# Altium footprint library ST封装.PcbLib: 1336 footprints (part 42 of 109)
Each footprint in its own frame and in the unit in brackets; x right, y up, seen from the top. Pads: shape width x height; smd on the part's side, far side on the other; paste and mask are expansions set on the pad; w line width, h text height; cw(c..) or ccw(c..) is an arc to the next point about the centre after c.
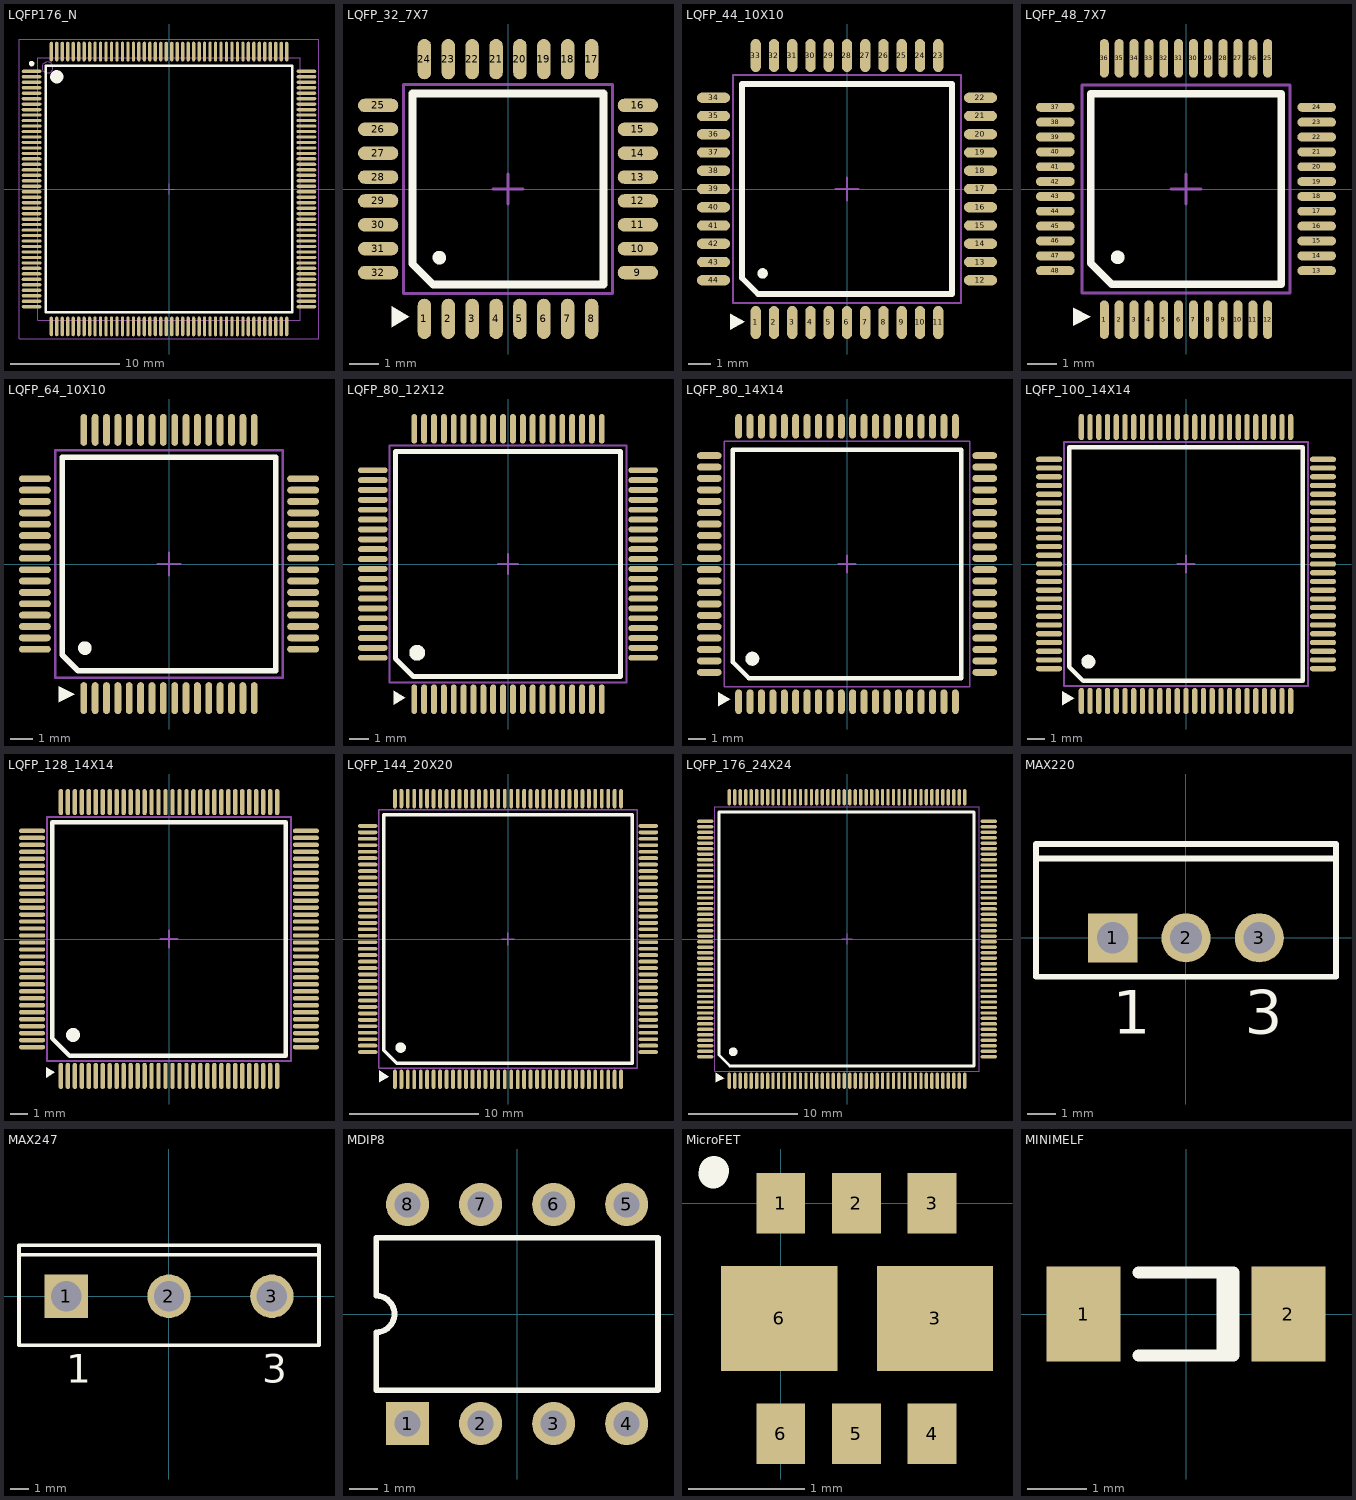
[diagram p41: the footprints below, top view; thin cyan lines are the x and y axes]

## LQFP176_N [mm] "Thin QFP, 176-Leads, Body 24x24mm, Pitch 0.5mm, IPC Medium Density"
height 1.6
pads (176):
  oval 1.8x0.3 smd: 1(-12.55,10.75) 2(-12.55,10.25) 3(-12.55,9.75) 4(-12.55,9.25) 5(-12.55,8.75) 6(-12.55,8.25) 7(-12.55,7.75) 8(-12.55,7.25) 9(-12.55,6.75) 10(-12.55,6.25) 11(-12.55,5.75) 12(-12.55,5.25) 13(-12.55,4.75) 14(-12.55,4.25) 15(-12.55,3.75) 16(-12.55,3.25) 17(-12.55,2.75) 18(-12.55,2.25) 19(-12.55,1.75) 20(-12.55,1.25) 21(-12.55,0.75) 22(-12.55,0.25) 23(-12.55,-0.25) 24(-12.55,-0.75) 25(-12.55,-1.25) 26(-12.55,-1.75) 27(-12.55,-2.25) 28(-12.55,-2.75) 29(-12.55,-3.25) 30(-12.55,-3.75) 31(-12.55,-4.25) 32(-12.55,-4.75) 33(-12.55,-5.25) 34(-12.55,-5.75) 35(-12.55,-6.25) 36(-12.55,-6.75) 37(-12.55,-7.25) 38(-12.55,-7.75) 39(-12.55,-8.25) 40(-12.55,-8.75) 41(-12.55,-9.25) 42(-12.55,-9.75) 43(-12.55,-10.25) 44(-12.55,-10.75) 89(12.55,-10.75) 90(12.55,-10.25) 91(12.55,-9.75) 92(12.55,-9.25) 93(12.55,-8.75) 94(12.55,-8.25) 95(12.55,-7.75) 96(12.55,-7.25) 97(12.55,-6.75) 98(12.55,-6.25) 99(12.55,-5.75) 100(12.55,-5.25) 101(12.55,-4.75) 102(12.55,-4.25) 103(12.55,-3.75) 104(12.55,-3.25) 105(12.55,-2.75) 106(12.55,-2.25) 107(12.55,-1.75) 108(12.55,-1.25) 109(12.55,-0.75) 110(12.55,-0.25) 111(12.55,0.25) 112(12.55,0.75) 113(12.55,1.25) 114(12.55,1.75) 115(12.55,2.25) 116(12.55,2.75) 117(12.55,3.25) 118(12.55,3.75) 119(12.55,4.25) 120(12.55,4.75) 121(12.55,5.25) 122(12.55,5.75) 123(12.55,6.25) 124(12.55,6.75) 125(12.55,7.25) 126(12.55,7.75) 127(12.55,8.25) 128(12.55,8.75) 129(12.55,9.25) 130(12.55,9.75) 131(12.55,10.25) 132(12.55,10.75)
  oval 0.3x1.8 smd: 45(-10.75,-12.55) 46(-10.25,-12.55) 47(-9.75,-12.55) 48(-9.25,-12.55) 49(-8.75,-12.55) 50(-8.25,-12.55) 51(-7.75,-12.55) 52(-7.25,-12.55) 53(-6.75,-12.55) 54(-6.25,-12.55) 55(-5.75,-12.55) 56(-5.25,-12.55) 57(-4.75,-12.55) 58(-4.25,-12.55) 59(-3.75,-12.55) 60(-3.25,-12.55) 61(-2.75,-12.55) 62(-2.25,-12.55) 63(-1.75,-12.55) 64(-1.25,-12.55) 65(-0.75,-12.55) 66(-0.25,-12.55) 67(0.25,-12.55) 68(0.75,-12.55) 69(1.25,-12.55) 70(1.75,-12.55) 71(2.25,-12.55) 72(2.75,-12.55) 73(3.25,-12.55) 74(3.75,-12.55) 75(4.25,-12.55) 76(4.75,-12.55) 77(5.25,-12.55) 78(5.75,-12.55) 79(6.25,-12.55) 80(6.75,-12.55) 81(7.25,-12.55) 82(7.75,-12.55) 83(8.25,-12.55) 84(8.75,-12.55) 85(9.25,-12.55) 86(9.75,-12.55) 87(10.25,-12.55) 88(10.75,-12.55) 133(10.75,12.55) 134(10.25,12.55) 135(9.75,12.55) 136(9.25,12.55) 137(8.75,12.55) 138(8.25,12.55) 139(7.75,12.55) 140(7.25,12.55) 141(6.75,12.55) 142(6.25,12.55) 143(5.75,12.55) 144(5.25,12.55) 145(4.75,12.55) 146(4.25,12.55) 147(3.75,12.55) 148(3.25,12.55) 149(2.75,12.55) 150(2.25,12.55) 151(1.75,12.55) 152(1.25,12.55) 153(0.75,12.55) 154(0.25,12.55) 155(-0.25,12.55) 156(-0.75,12.55) 157(-1.25,12.55) 158(-1.75,12.55) 159(-2.25,12.55) 160(-2.75,12.55) 161(-3.25,12.55) 162(-3.75,12.55) 163(-4.25,12.55) 164(-4.75,12.55) 165(-5.25,12.55) 166(-5.75,12.55) 167(-6.25,12.55) 168(-6.75,12.55) 169(-7.25,12.55) 170(-7.75,12.55) 171(-8.25,12.55) 172(-8.75,12.55) 173(-9.25,12.55) 174(-9.75,12.55) 175(-10.25,12.55) 176(-10.75,12.55)
Top Overlay:
  circle w0.25: c-12.55,11.45 r0.125
  circle w0.6: c-10.25,10.25 r0.3
  lines w0.2: -11.25,-11.25 -11.25,11.25 11.25,11.25 11.25,-11.25 -11.25,-11.25
Mechanical 13:
  circle w0.1: c-11.1,11.1 r0.5
  lines w0.1: -12,-12 -12,12 12,12 12,-12 -12,-12
Mechanical 15:
  lines w0.05: -13.7,-13.7 -13.7,13.7 13.7,13.7 13.7,-13.7 -13.7,-13.7
  lines w0.1: -0.5,0 0.5,0 ; 0,-0.5 0,0.5
3D body: height 1.6, standoff 0, extent -12,-12 12,12

## LQFP_32_7X7 [mm]
pads (32):
  oval 0.45x1.35 smd: 1(-2.8,-4.35) 2(-2,-4.35) 3(-1.2,-4.35) 4(-0.4,-4.35) 5(0.4,-4.35) 6(1.2,-4.35) 7(2,-4.35) 8(2.8,-4.35) 17(2.8,4.35) 18(2,4.35) 19(1.2,4.35) 20(0.4,4.35) 21(-0.4,4.35) 22(-1.2,4.35) 23(-2,4.35) 24(-2.8,4.35)
  oval 1.35x0.45 smd: 9(4.35,-2.8) 10(4.35,-2) 11(4.35,-1.2) 12(4.35,-0.4) 13(4.35,0.4) 14(4.35,1.2) 15(4.35,2) 16(4.35,2.8) 25(-4.35,2.8) 26(-4.35,2) 27(-4.35,1.2) 28(-4.35,0.4) 29(-4.35,-0.4) 30(-4.35,-1.2) 31(-4.35,-2) 32(-4.35,-2.8)
Top Overlay:
  circle w0.254: c-2.3,-2.3 r0.1
  region: -3.3,-4.275 -3.9,-3.925 -3.9,-4.625
  lines w0.254: -3.2,-2.5 -2.5,-3.2 3.2,-3.2 3.2,3.2 -3.2,3.2 -3.2,-2.5
Mechanical 15:
  lines w0.1: -0.5,0 0.5,0 ; 0,-0.5 0,0.5 ; -3.5,-3.5 3.5,-3.5 3.5,3.5 -3.5,3.5 -3.5,-3.5
3D body "LQFP-32-9x9.STEP": height 1.62, standoff -0.01, extent -4.572,-4.57 4.572,4.573

## LQFP_44_10X10 [mm]
pads (44):
  oval 0.45x1.45 smd: 1(-4,-5.85) 2(-3.2,-5.85) 3(-2.4,-5.85) 4(-1.6,-5.85) 5(-0.8,-5.85) 6(0,-5.85) 7(0.8,-5.85) 8(1.6,-5.85) 9(2.4,-5.85) 10(3.2,-5.85) 11(4,-5.85) 23(4,5.85) 24(3.2,5.85) 25(2.4,5.85) 26(1.6,5.85) 27(0.8,5.85) 28(0,5.85) 29(-0.8,5.85) 30(-1.6,5.85) 31(-2.4,5.85) 32(-3.2,5.85) 33(-4,5.85)
  oval 1.45x0.45 smd: 12(5.85,-4) 13(5.85,-3.2) 14(5.85,-2.4) 15(5.85,-1.6) 16(5.85,-0.8) 17(5.85,0) 18(5.85,0.8) 19(5.85,1.6) 20(5.85,2.4) 21(5.85,3.2) 22(5.85,4) 34(-5.85,4) 35(-5.85,3.2) 36(-5.85,2.4) 37(-5.85,1.6) 38(-5.85,0.8) 39(-5.85,0) 40(-5.85,-0.8) 41(-5.85,-1.6) 42(-5.85,-2.4) 43(-5.85,-3.2) 44(-5.85,-4)
Top Overlay:
  circle w0.254: c-3.7,-3.7 r0.1
  region: -4.488,-5.825 -5.113,-5.475 -5.113,-6.175
  lines w0.254: -4.6,-3.9 -3.9,-4.6 4.6,-4.6 4.6,4.6 -4.6,4.6 -4.6,-3.9
Mechanical 15:
  lines w0.1: -0.5,0 0.5,0 ; 0,-0.5 0,0.5 ; -5,-5 5,-5 5,5 -5,5 -5,-5
3D body "LQFP-44-10X10.step": height 1.5, standoff 0.02, extent -6,-6 6,6

## LQFP_48_7X7 [mm]
pads (48):
  oval 0.3x1.3 smd: 1(-2.75,-4.4) 2(-2.25,-4.4) 3(-1.75,-4.4) 4(-1.25,-4.4) 5(-0.75,-4.4) 6(-0.25,-4.4) 7(0.25,-4.4) 8(0.75,-4.4) 9(1.25,-4.4) 10(1.75,-4.4) 11(2.25,-4.4) 12(2.75,-4.4) 25(2.75,4.4) 26(2.25,4.4) 27(1.75,4.4) 28(1.25,4.4) 29(0.75,4.4) 30(0.25,4.4) 31(-0.25,4.4) 32(-0.75,4.4) 33(-1.25,4.4) 34(-1.75,4.4) 35(-2.25,4.4) 36(-2.75,4.4)
  oval 1.3x0.3 smd: 13(4.4,-2.75) 14(4.4,-2.25) 15(4.4,-1.75) 16(4.4,-1.25) 17(4.4,-0.75) 18(4.4,-0.25) 19(4.4,0.25) 20(4.4,0.75) 21(4.4,1.25) 22(4.4,1.75) 23(4.4,2.25) 24(4.4,2.75) 37(-4.4,2.75) 38(-4.4,2.25) 39(-4.4,1.75) 40(-4.4,1.25) 41(-4.4,0.75) 42(-4.4,0.25) 43(-4.4,-0.25) 44(-4.4,-0.75) 45(-4.4,-1.25) 46(-4.4,-1.75) 47(-4.4,-2.25) 48(-4.4,-2.75)
Top Overlay:
  circle w0.254: c-2.3,-2.3 r0.1
  region: -3.2,-4.3 -3.8,-4 -3.8,-4.6
  lines w0.254: -3.2,-2.5 -3.2,3.2 3.2,3.2 3.2,-3.2 -2.5,-3.2 -3.2,-2.5
Mechanical 15:
  lines w0.1: -0.5,0 0.5,0 ; 0,-0.5 0,0.5 ; -3.5,-3.5 -3.5,3.5 3.5,3.5 3.5,-3.5 -3.5,-3.5
3D body "LQFP-48-7x7.STEP": height 1.62, standoff -0.01, extent -4.572,-4.57 4.572,4.573

## LQFP_64_10X10 [mm]
pads (64):
  oval 0.3x1.4 smd: 1(-3.75,-5.9) 2(-3.25,-5.9) 3(-2.75,-5.9) 4(-2.25,-5.9) 5(-1.75,-5.9) 6(-1.25,-5.9) 7(-0.75,-5.9) 8(-0.25,-5.9) 9(0.25,-5.9) 10(0.75,-5.9) 11(1.25,-5.9) 12(1.75,-5.9) 13(2.25,-5.9) 14(2.75,-5.9) 15(3.25,-5.9) 16(3.75,-5.9) 33(3.75,5.9) 34(3.25,5.9) 35(2.75,5.9) 36(2.25,5.9) 37(1.75,5.9) 38(1.25,5.9) 39(0.75,5.9) 40(0.25,5.9) 41(-0.25,5.9) 42(-0.75,5.9) 43(-1.25,5.9) 44(-1.75,5.9) 45(-2.25,5.9) 46(-2.75,5.9) 47(-3.25,5.9) 48(-3.75,5.9)
  oval 1.4x0.3 smd: 17(5.9,-3.75) 18(5.9,-3.25) 19(5.9,-2.75) 20(5.9,-2.25) 21(5.9,-1.75) 22(5.9,-1.25) 23(5.9,-0.75) 24(5.9,-0.25) 25(5.9,0.25) 26(5.9,0.75) 27(5.9,1.25) 28(5.9,1.75) 29(5.9,2.25) 30(5.9,2.75) 31(5.9,3.25) 32(5.9,3.75) 49(-5.9,3.75) 50(-5.9,3.25) 51(-5.9,2.75) 52(-5.9,2.25) 53(-5.9,1.75) 54(-5.9,1.25) 55(-5.9,0.75) 56(-5.9,0.25) 57(-5.9,-0.25) 58(-5.9,-0.75) 59(-5.9,-1.25) 60(-5.9,-1.75) 61(-5.9,-2.25) 62(-5.9,-2.75) 63(-5.9,-3.25) 64(-5.9,-3.75)
Top Overlay:
  circle w0.4: c-3.7,-3.7 r0.1
  region: -4.15,-5.725 -4.85,-5.375 -4.85,-6.075
  lines w0.254: -4.7,-4 -4.7,4.7 4.7,4.7 4.7,-4.7 -4,-4.7 -4.7,-4
Mechanical 15:
  lines w0.1: -0.5,0 0.5,0 ; 0,-0.5 0,0.5 ; -5,-5 5,-5 5,5 -5,5 -5,-5
3D body "LQFP-64-10x10.STEP": height 1.62, standoff -0.01, extent -6.072,-6.07 6.072,6.073

## LQFP_80_12X12 [mm]
pads (80):
  oval 0.3x1.5 smd: 1(-4.75,-6.85) 2(-4.25,-6.85) 3(-3.75,-6.85) 4(-3.25,-6.85) 5(-2.75,-6.85) 6(-2.25,-6.85) 7(-1.75,-6.85) 8(-1.25,-6.85) 9(-0.75,-6.85) 10(-0.25,-6.85) 11(0.25,-6.85) 12(0.75,-6.85) 13(1.25,-6.85) 14(1.75,-6.85) 15(2.25,-6.85) 16(2.75,-6.85) 17(3.25,-6.85) 18(3.75,-6.85) 19(4.25,-6.85) 20(4.75,-6.85) 41(4.75,6.85) 42(4.25,6.85) 43(3.75,6.85) 44(3.25,6.85) 45(2.75,6.85) 46(2.25,6.85) 47(1.75,6.85) 48(1.25,6.85) 49(0.75,6.85) 50(0.25,6.85) 51(-0.25,6.85) 52(-0.75,6.85) 53(-1.25,6.85) 54(-1.75,6.85) 55(-2.25,6.85) 56(-2.75,6.85) 57(-3.25,6.85) 58(-3.75,6.85) 59(-4.25,6.85) 60(-4.75,6.85)
  oval 1.5x0.3 smd: 21(6.85,-4.75) 22(6.85,-4.25) 23(6.85,-3.75) 24(6.85,-3.25) 25(6.85,-2.75) 26(6.85,-2.25) 27(6.85,-1.75) 28(6.85,-1.25) 29(6.85,-0.75) 30(6.85,-0.25) 31(6.85,0.25) 32(6.85,0.75) 33(6.85,1.25) 34(6.85,1.75) 35(6.85,2.25) 36(6.85,2.75) 37(6.85,3.25) 38(6.85,3.75) 39(6.85,4.25) 40(6.85,4.75) 61(-6.85,4.75) 62(-6.85,4.25) 63(-6.85,3.75) 64(-6.85,3.25) 65(-6.85,2.75) 66(-6.85,2.25) 67(-6.85,1.75) 68(-6.85,1.25) 69(-6.85,0.75) 70(-6.85,0.25) 71(-6.85,-0.25) 72(-6.85,-0.75) 73(-6.85,-1.25) 74(-6.85,-1.75) 75(-6.85,-2.25) 76(-6.85,-2.75) 77(-6.85,-3.25) 78(-6.85,-3.75) 79(-6.85,-4.25) 80(-6.85,-4.75)
Top Overlay:
  circle w0.4: c-4.6,-4.5 r0.2
  region: -5.2,-6.775 -5.8,-6.425 -5.8,-7.125
  lines w0.254: -5.7,-4.8 -5.7,5.7 5.7,5.7 5.7,-5.7 -4.8,-5.7 -5.7,-4.8
Mechanical 15:
  lines w0.1: -0.5,0 0.5,0 ; 0,-0.5 0,0.5 ; -6,-6 -6,6 6,6 6,-6 -6,-6
3D body "LQFP-80-12X12.STEP": height 1.62, standoff -0.01, extent -7.073,-7.073 7.07,7.07

## LQFP_80_14X14 [mm]
pads (80):
  oval 0.4x1.4 smd mask+0.051: 1(-6.175,-7.85) 2(-5.525,-7.85) 3(-4.875,-7.85) 4(-4.225,-7.85) 5(-3.575,-7.85) 6(-2.925,-7.85) 7(-2.275,-7.85) 8(-1.625,-7.85) 9(-0.975,-7.85) 10(-0.325,-7.85) 11(0.325,-7.85) 12(0.975,-7.85) 13(1.625,-7.85) 14(2.275,-7.85) 15(2.925,-7.85) 16(3.575,-7.85) 17(4.225,-7.85) 18(4.875,-7.85) 19(5.525,-7.85) 20(6.175,-7.85) 41(6.175,7.85) 42(5.525,7.85) 43(4.875,7.85) 44(4.225,7.85) 45(3.575,7.85) 46(2.925,7.85) 47(2.275,7.85) 48(1.625,7.85) 49(0.975,7.85) 50(0.325,7.85) 51(-0.325,7.85) 52(-0.975,7.85) 53(-1.625,7.85) 54(-2.275,7.85) 55(-2.925,7.85) 56(-3.575,7.85) 57(-4.225,7.85) 58(-4.875,7.85) 59(-5.525,7.85) 60(-6.175,7.85)
  oval 1.4x0.4 smd mask+0.051: 21(7.85,-6.175) 22(7.85,-5.525) 23(7.85,-4.875) 24(7.85,-4.225) 25(7.85,-3.575) 26(7.85,-2.925) 27(7.85,-2.275) 28(7.85,-1.625) 29(7.85,-0.975) 30(7.85,-0.325) 31(7.85,0.325) 32(7.85,0.975) 33(7.85,1.625) 34(7.85,2.275) 35(7.85,2.925) 36(7.85,3.575) 37(7.85,4.225) 38(7.85,4.875) 39(7.85,5.525) 40(7.85,6.175) 61(-7.85,6.175) 62(-7.85,5.525) 63(-7.85,4.875) 64(-7.85,4.225) 65(-7.85,3.575) 66(-7.85,2.925) 67(-7.85,2.275) 68(-7.85,1.625) 69(-7.85,0.975) 70(-7.85,0.325) 71(-7.85,-0.325) 72(-7.85,-0.975) 73(-7.85,-1.625) 74(-7.85,-2.275) 75(-7.85,-2.925) 76(-7.85,-3.575) 77(-7.85,-4.225) 78(-7.85,-4.875) 79(-7.85,-5.525) 80(-7.85,-6.175)
Top Overlay:
  circle w0.4: c-5.4,-5.4 r0.2
  region: -7.35,-7.3 -7.35,-8.1 -6.65,-7.7
  lines w0.254: -6.5,-5.6 -6.5,6.5 6.5,6.5 6.5,-6.5 -5.6,-6.5 -6.5,-5.6
Mechanical 15:
  lines w0.1: -0.5,0 0.5,0 ; 0,-0.5 0,0.5 ; -7,-7 7,-7 7,7 -7,7 -7,-7
3D body "LQFP-80-14x14.step": height 1.58, standoff -0.01, extent -8.005,-8 8.005,8.009

## LQFP_100_14X14 [mm]
pads (100):
  oval 0.3x1.5 smd: 1(-6,-7.85) 2(-5.5,-7.85) 3(-5,-7.85) 4(-4.5,-7.85) 5(-4,-7.85) 6(-3.5,-7.85) 7(-3,-7.85) 8(-2.5,-7.85) 9(-2,-7.85) 10(-1.5,-7.85) 11(-1,-7.85) 12(-0.5,-7.85) 13(0,-7.85) 14(0.5,-7.85) 15(1,-7.85) 16(1.5,-7.85) 17(2,-7.85) 18(2.5,-7.85) 19(3,-7.85) 20(3.5,-7.85) 21(4,-7.85) 22(4.5,-7.85) 23(5,-7.85) 24(5.5,-7.85) 25(6,-7.85) 51(6,7.85) 52(5.5,7.85) 53(5,7.85) 54(4.5,7.85) 55(4,7.85) 56(3.5,7.85) 57(3,7.85) 58(2.5,7.85) 59(2,7.85) 60(1.5,7.85) 61(1,7.85) 62(0.5,7.85) 63(0,7.85) 64(-0.5,7.85) 65(-1,7.85) 66(-1.5,7.85) 67(-2,7.85) 68(-2.5,7.85) 69(-3,7.85) 70(-3.5,7.85) 71(-4,7.85) 72(-4.5,7.85) 73(-5,7.85) 74(-5.5,7.85) 75(-6,7.85)
  oval 1.5x0.3 smd: 26(7.85,-6) 27(7.85,-5.5) 28(7.85,-5) 29(7.85,-4.5) 30(7.85,-4) 31(7.85,-3.5) 32(7.85,-3) 33(7.85,-2.5) 34(7.85,-2) 35(7.85,-1.5) 36(7.85,-1) 37(7.85,-0.5) 38(7.85,0) 39(7.85,0.5) 40(7.85,1) 41(7.85,1.5) 42(7.85,2) 43(7.85,2.5) 44(7.85,3) 45(7.85,3.5) 46(7.85,4) 47(7.85,4.5) 48(7.85,5) 49(7.85,5.5) 50(7.85,6) 76(-7.85,6) 77(-7.85,5.5) 78(-7.85,5) 79(-7.85,4.5) 80(-7.85,4) 81(-7.85,3.5) 82(-7.85,3) 83(-7.85,2.5) 84(-7.85,2) 85(-7.85,1.5) 86(-7.85,1) 87(-7.85,0.5) 88(-7.85,0) 89(-7.85,-0.5) 90(-7.85,-1) 91(-7.85,-1.5) 92(-7.85,-2) 93(-7.85,-2.5) 94(-7.85,-3) 95(-7.85,-3.5) 96(-7.85,-4) 97(-7.85,-4.5) 98(-7.85,-5) 99(-7.85,-5.5) 100(-7.85,-6)
Top Overlay:
  circle w0.4: c-5.6,-5.6 r0.2
  region: -6.4,-7.7 -7.1,-7.3 -7.1,-8.1
  lines w0.254: -6.7,-5.9 -6.7,6.7 6.7,6.7 6.7,-6.7 -5.9,-6.7 -6.7,-5.9
Mechanical 15:
  lines w0.1: -0.5,0 0.5,0 ; 0,-0.5 0,0.5 ; -7,-7 7,-7 7,7 -7,7 -7,-7
3D body "LQFP-100-14x14.STEP": height 1.62, standoff -0.01, extent -8.072,-8.08 8.072,8.063

## LQFP_128_14X14 [mm]
pads (128):
  oval 0.25x1.5 smd mask+0.051: 1(-6.2,-7.85) 2(-5.8,-7.85) 3(-5.4,-7.85) 4(-5,-7.85) 5(-4.6,-7.85) 6(-4.2,-7.85) 7(-3.8,-7.85) 8(-3.4,-7.85) 9(-3,-7.85) 10(-2.6,-7.85) 11(-2.2,-7.85) 12(-1.8,-7.85) 13(-1.4,-7.85) 14(-1,-7.85) 15(-0.6,-7.85) 16(-0.2,-7.85) 17(0.2,-7.85) 18(0.6,-7.85) 19(1,-7.85) 20(1.4,-7.85) 21(1.8,-7.85) 22(2.2,-7.85) 23(2.6,-7.85) 24(3,-7.85) 25(3.4,-7.85) 26(3.8,-7.85) 27(4.2,-7.85) 28(4.6,-7.85) 29(5,-7.85) 30(5.4,-7.85) 31(5.8,-7.85) 32(6.2,-7.85) 65(6.2,7.85) 66(5.8,7.85) 67(5.4,7.85) 68(5,7.85) 69(4.6,7.85) 70(4.2,7.85) 71(3.8,7.85) 72(3.4,7.85) 73(3,7.85) 74(2.6,7.85) 75(2.2,7.85) 76(1.8,7.85) 77(1.4,7.85) 78(1,7.85) 79(0.6,7.85) 80(0.2,7.85) 81(-0.2,7.85) 82(-0.6,7.85) 83(-1,7.85) 84(-1.4,7.85) 85(-1.8,7.85) 86(-2.2,7.85) 87(-2.6,7.85) 88(-3,7.85) 89(-3.4,7.85) 90(-3.8,7.85) 91(-4.2,7.85) 92(-4.6,7.85) 93(-5,7.85) 94(-5.4,7.85) 95(-5.8,7.85) 96(-6.2,7.85)
  oval 1.5x0.25 smd mask+0.051: 33(7.85,-6.2) 34(7.85,-5.8) 35(7.85,-5.4) 36(7.85,-5) 37(7.85,-4.6) 38(7.85,-4.2) 39(7.85,-3.8) 40(7.85,-3.4) 41(7.85,-3) 42(7.85,-2.6) 43(7.85,-2.2) 44(7.85,-1.8) 45(7.85,-1.4) 46(7.85,-1) 47(7.85,-0.6) 48(7.85,-0.2) 49(7.85,0.2) 50(7.85,0.6) 51(7.85,1) 52(7.85,1.4) 53(7.85,1.8) 54(7.85,2.2) 55(7.85,2.6) 56(7.85,3) 57(7.85,3.4) 58(7.85,3.8) 59(7.85,4.2) 60(7.85,4.6) 61(7.85,5) 62(7.85,5.4) 63(7.85,5.8) 64(7.85,6.2) 97(-7.85,6.2) 98(-7.85,5.8) 99(-7.85,5.4) 100(-7.85,5) 101(-7.85,4.6) 102(-7.85,4.2) 103(-7.85,3.8) 104(-7.85,3.4) 105(-7.85,3) 106(-7.85,2.6) 107(-7.85,2.2) 108(-7.85,1.8) 109(-7.85,1.4) 110(-7.85,1) 111(-7.85,0.6) 112(-7.85,0.2) 113(-7.85,-0.2) 114(-7.85,-0.6) 115(-7.85,-1) 116(-7.85,-1.4) 117(-7.85,-1.8) 118(-7.85,-2.2) 119(-7.85,-2.6) 120(-7.85,-3) 121(-7.85,-3.4) 122(-7.85,-3.8) 123(-7.85,-4.2) 124(-7.85,-4.6) 125(-7.85,-5) 126(-7.85,-5.4) 127(-7.85,-5.8) 128(-7.85,-6.2)
Top Overlay:
  circle w0.4: c-5.5,-5.5 r0.2
  region: -7.05,-7.95 -6.55,-7.65 -7.05,-7.35
  lines w0.254: -6.7,-5.7 -6.7,6.7 6.7,6.7 6.7,-6.7 -5.7,-6.7 -6.7,-5.7
Mechanical 15:
  lines w0.1: -0.5,0 0.5,0 ; 0,-0.5 0,0.5 ; -7,-7 -7,7 7,7 7,-7 -7,-7
3D body "LQFP-128-14X14.step": height 1.35, standoff 0, extent -8,-8 8,8

## LQFP_144_20X20 [mm]
pads (144):
  oval 0.3x1.5 smd: 1(-8.75,-10.85) 2(-8.25,-10.85) 3(-7.75,-10.85) 4(-7.25,-10.85) 5(-6.75,-10.85) 6(-6.25,-10.85) 7(-5.75,-10.85) 8(-5.25,-10.85) 9(-4.75,-10.85) 10(-4.25,-10.85) 11(-3.75,-10.85) 12(-3.25,-10.85) 13(-2.75,-10.85) 14(-2.25,-10.85) 15(-1.75,-10.85) 16(-1.25,-10.85) 17(-0.75,-10.85) 18(-0.25,-10.85) 19(0.25,-10.85) 20(0.75,-10.85) 21(1.25,-10.85) 22(1.75,-10.85) 23(2.25,-10.85) 24(2.75,-10.85) 25(3.25,-10.85) 26(3.75,-10.85) 27(4.25,-10.85) 28(4.75,-10.85) 29(5.25,-10.85) 30(5.75,-10.85) 31(6.25,-10.85) 32(6.75,-10.85) 33(7.25,-10.85) 34(7.75,-10.85) 35(8.25,-10.85) 36(8.75,-10.85) 73(8.75,10.85) 74(8.25,10.85) 75(7.75,10.85) 76(7.25,10.85) 77(6.75,10.85) 78(6.25,10.85) 79(5.75,10.85) 80(5.25,10.85) 81(4.75,10.85) 82(4.25,10.85) 83(3.75,10.85) 84(3.25,10.85) 85(2.75,10.85) 86(2.25,10.85) 87(1.75,10.85) 88(1.25,10.85) 89(0.75,10.85) 90(0.25,10.85) 91(-0.25,10.85) 92(-0.75,10.85) 93(-1.25,10.85) 94(-1.75,10.85) 95(-2.25,10.85) 96(-2.75,10.85) 97(-3.25,10.85) 98(-3.75,10.85) 99(-4.25,10.85) 100(-4.75,10.85) 101(-5.25,10.85) 102(-5.75,10.85) 103(-6.25,10.85) 104(-6.75,10.85) 105(-7.25,10.85) 106(-7.75,10.85) 107(-8.25,10.85) 108(-8.75,10.85)
  oval 1.5x0.3 smd: 37(10.85,-8.75) 38(10.85,-8.25) 39(10.85,-7.75) 40(10.85,-7.25) 41(10.85,-6.75) 42(10.85,-6.25) 43(10.85,-5.75) 44(10.85,-5.25) 45(10.85,-4.75) 46(10.85,-4.25) 47(10.85,-3.75) 48(10.85,-3.25) 49(10.85,-2.75) 50(10.85,-2.25) 51(10.85,-1.75) 52(10.85,-1.25) 53(10.85,-0.75) 54(10.85,-0.25) 55(10.85,0.25) 56(10.85,0.75) 57(10.85,1.25) 58(10.85,1.75) 59(10.85,2.25) 60(10.85,2.75) 61(10.85,3.25) 62(10.85,3.75) 63(10.85,4.25) 64(10.85,4.75) 65(10.85,5.25) 66(10.85,5.75) 67(10.85,6.25) 68(10.85,6.75) 69(10.85,7.25) 70(10.85,7.75) 71(10.85,8.25) 72(10.85,8.75) 109(-10.85,8.75) 110(-10.85,8.25) 111(-10.85,7.75) 112(-10.85,7.25) 113(-10.85,6.75) 114(-10.85,6.25) 115(-10.85,5.75) 116(-10.85,5.25) 117(-10.85,4.75) 118(-10.85,4.25) 119(-10.85,3.75) 120(-10.85,3.25) 121(-10.85,2.75) 122(-10.85,2.25) 123(-10.85,1.75) 124(-10.85,1.25) 125(-10.85,0.75) 126(-10.85,0.25) 127(-10.85,-0.25) 128(-10.85,-0.75) 129(-10.85,-1.25) 130(-10.85,-1.75) 131(-10.85,-2.25) 132(-10.85,-2.75) 133(-10.85,-3.25) 134(-10.85,-3.75) 135(-10.85,-4.25) 136(-10.85,-4.75) 137(-10.85,-5.25) 138(-10.85,-5.75) 139(-10.85,-6.25) 140(-10.85,-6.75) 141(-10.85,-7.25) 142(-10.85,-7.75) 143(-10.85,-8.25) 144(-10.85,-8.75)
Top Overlay:
  circle w0.4: c-8.3,-8.4 r0.2
  region: -9.225,-10.637 -9.975,-10.162 -9.975,-11.062
  lines w0.254: -9.6,-8.6 -9.6,9.6 9.6,9.6 9.6,-9.6 -8.6,-9.6 -9.6,-8.6
Mechanical 15:
  lines w0.1: -0.5,0 0.5,0 ; 0,-0.5 0,0.5 ; -10,-10 10,-10 10,10 -10,10 -10,-10
3D body "LQFP-144-20x20.STEP": height 1.88, standoff -0.01, extent -11.102,-11.1 11.1,11.102

## LQFP_176_24X24 [mm]
pads (176):
  oval 0.3x1.5 smd: 1(-10.75,-12.95) 2(-10.25,-12.95) 3(-9.75,-12.95) 4(-9.25,-12.95) 5(-8.75,-12.95) 6(-8.25,-12.95) 7(-7.75,-12.95) 8(-7.25,-12.95) 9(-6.75,-12.95) 10(-6.25,-12.95) 11(-5.75,-12.95) 12(-5.25,-12.95) 13(-4.75,-12.95) 14(-4.25,-12.95) 15(-3.75,-12.95) 16(-3.25,-12.95) 17(-2.75,-12.95) 18(-2.25,-12.95) 19(-1.75,-12.95) 20(-1.25,-12.95) 21(-0.75,-12.95) 22(-0.25,-12.95) 23(0.25,-12.95) 24(0.75,-12.95) 25(1.25,-12.95) 26(1.75,-12.95) 27(2.25,-12.95) 28(2.75,-12.95) 29(3.25,-12.95) 30(3.75,-12.95) 31(4.25,-12.95) 32(4.75,-12.95) 33(5.25,-12.95) 34(5.75,-12.95) 35(6.25,-12.95) 36(6.75,-12.95) 37(7.25,-12.95) 38(7.75,-12.95) 39(8.25,-12.95) 40(8.75,-12.95) 41(9.25,-12.95) 42(9.75,-12.95) 43(10.25,-12.95) 44(10.75,-12.95) 89(10.75,12.95) 90(10.25,12.95) 91(9.75,12.95) 92(9.25,12.95) 93(8.75,12.95) 94(8.25,12.95) 95(7.75,12.95) 96(7.25,12.95) 97(6.75,12.95) 98(6.25,12.95) 99(5.75,12.95) 100(5.25,12.95) 101(4.75,12.95) 102(4.25,12.95) 103(3.75,12.95) 104(3.25,12.95) 105(2.75,12.95) 106(2.25,12.95) 107(1.75,12.95) 108(1.25,12.95) 109(0.75,12.95) 110(0.25,12.95) 111(-0.25,12.95) 112(-0.75,12.95) 113(-1.25,12.95) 114(-1.75,12.95) 115(-2.25,12.95) 116(-2.75,12.95) 117(-3.25,12.95) 118(-3.75,12.95) 119(-4.25,12.95) 120(-4.75,12.95) 121(-5.25,12.95) 122(-5.75,12.95) 123(-6.25,12.95) 124(-6.75,12.95) 125(-7.25,12.95) 126(-7.75,12.95) 127(-8.25,12.95) 128(-8.75,12.95) 129(-9.25,12.95) 130(-9.75,12.95) 131(-10.25,12.95) 132(-10.75,12.95)
  oval 1.5x0.3 smd: 45(12.95,-10.75) 46(12.95,-10.25) 47(12.95,-9.75) 48(12.95,-9.25) 49(12.95,-8.75) 50(12.95,-8.25) 51(12.95,-7.75) 52(12.95,-7.25) 53(12.95,-6.75) 54(12.95,-6.25) 55(12.95,-5.75) 56(12.95,-5.25) 57(12.95,-4.75) 58(12.95,-4.25) 59(12.95,-3.75) 60(12.95,-3.25) 61(12.95,-2.75) 62(12.95,-2.25) 63(12.95,-1.75) 64(12.95,-1.25) 65(12.95,-0.75) 66(12.95,-0.25) 67(12.95,0.25) 68(12.95,0.75) 69(12.95,1.25) 70(12.95,1.75) 71(12.95,2.25) 72(12.95,2.75) 73(12.95,3.25) 74(12.95,3.75) 75(12.95,4.25) 76(12.95,4.75) 77(12.95,5.25) 78(12.95,5.75) 79(12.95,6.25) 80(12.95,6.75) 81(12.95,7.25) 82(12.95,7.75) 83(12.95,8.25) 84(12.95,8.75) 85(12.95,9.25) 86(12.95,9.75) 87(12.95,10.25) 88(12.95,10.75) 133(-12.95,10.75) 134(-12.95,10.25) 135(-12.95,9.75) 136(-12.95,9.25) 137(-12.95,8.75) 138(-12.95,8.25) 139(-12.95,7.75) 140(-12.95,7.25) 141(-12.95,6.75) 142(-12.95,6.25) 143(-12.95,5.75) 144(-12.95,5.25) 145(-12.95,4.75) 146(-12.95,4.25) 147(-12.95,3.75) 148(-12.95,3.25) 149(-12.95,2.75) 150(-12.95,2.25) 151(-12.95,1.75) 152(-12.95,1.25) 153(-12.95,0.75) 154(-12.95,0.25) 155(-12.95,-0.25) 156(-12.95,-0.75) 157(-12.95,-1.25) 158(-12.95,-1.75) 159(-12.95,-2.25) 160(-12.95,-2.75) 161(-12.95,-3.25) 162(-12.95,-3.75) 163(-12.95,-4.25) 164(-12.95,-4.75) 165(-12.95,-5.25) 166(-12.95,-5.75) 167(-12.95,-6.25) 168(-12.95,-6.75) 169(-12.95,-7.25) 170(-12.95,-7.75) 171(-12.95,-8.25) 172(-12.95,-8.75) 173(-12.95,-9.25) 174(-12.95,-9.75) 175(-12.95,-10.25) 176(-12.95,-10.75)
Top Overlay:
  circle w0.4: c-10.4,-10.3 r0.2
  region: -11.2,-12.7 -12,-12.2 -12,-13.1
  lines w0.254: -11.7,-10.6 -11.7,11.6 11.6,11.6 11.6,-11.6 -10.7,-11.6 -11.7,-10.6
Mechanical 15:
  lines w0.1: -0.5,0 0.5,0 ; 0,-0.5 0,0.5 ; -12.1,-12.1 12.1,-12.1 12.1,12.1 -12.1,12.1 -12.1,-12.1
3D body "LQFP-176-24X24.step": height 1.56, standoff -0.01, extent -12.892,-12.886 12.88,12.886

## MAX220 [mm] "SIP; 3 Leads; Body 16 x 10.2 x 4.5 mm (typ); Pitch 2.54 mm"
height 19.7
pads (3):
  rect 1.7x1.7 hole 1.1: 1(-2.54,0)
  round 1.7 hole 1.1: 2(0,0) 3(2.54,0)
Top Overlay:
  lines w0.2: -5.2,2.75 5.2,2.75 ; -5.2,-1.35 -5.2,3.25 5.2,3.25 5.2,-1.35 -5.2,-1.35
  text "3" at 2.032,-3.33 h1.5
  text "1" at -2.54,-3.33 h1.5

## MAX247 [mm] "SIP; 3 Leads; Body 20 x 15.6 x 5 mm (typ); Pitch 5.45 mm"
height 24.6
pads (3):
  rect 2.3x2.3 hole 1.6: 1(-5.45,0)
  round 2.3 hole 1.6: 2(0,0) 3(5.45,0)
Top Overlay:
  lines w0.2: -7.95,2.2 7.95,2.2 ; -7.95,-2.6 -7.95,2.7 7.95,2.7 7.95,-2.6 -7.95,-2.6
  text "3" at 4.942,-4.58 h1.5
  text "1" at -5.45,-4.58 h1.5

## MDIP8 [mm] "DIP; 8 Leads; Row Spacing 7.62 mm; Pitch 2.54 mm"
height 4.8
pads (8):
  rect 1.5x1.5 hole 0.9: 1(-3.81,-3.81)
  round 1.5 hole 0.9: 2(-1.27,-3.81) 3(1.27,-3.81) 4(3.81,-3.81) 5(3.81,3.81) 6(1.27,3.81) 7(-1.27,3.81) 8(-3.81,3.81)
Top Overlay:
  lines w0.2: -4.9,-2.65 -4.9,-0.635 ccw(c-4.9,0) -4.9,0.635 -4.9,2.65 4.9,2.65 4.9,-2.65 -4.9,-2.65

## MicroFET [mm]
pads (8):
  rect 0.42x0.52 smd: 1(0,0) 2(0.65,0) 3(1.3,0) 4(1.3,-1.981) 5(0.65,-1.981) 6(0,-1.981)
  rect 1x0.9 smd: 3(1.325,-0.991) 6(-0.012,-0.991)
Top Overlay:
  lines w0.254: -0.58,0.254 ccw(c-0.63,0.279) -0.574,0.279

## MINIMELF [mm] "Metal Electrode Face (MELF) Diode; Body 3.5 x 1.5 mm (LxDia)"
height 1.5
pads (2):
  rect 1.25x1.6 smd: 1(-1.725,0) 2(1.725,0)
Top Overlay:
  lines w0.2: -0.8,-0.7 0.8,-0.7 0.8,0.7 -0.8,0.7 ; 0.61,-0.7 0.61,0.7